# Altium footprint library MS-Electronic.PcbLib: 213 footprints (part 14 of 14)
Each footprint in its own frame and in the unit in brackets; x right, y up, seen from the top. Pads: shape width x height; smd on the part's side, far side on the other; paste and mask are expansions set on the pad; w line width, h text height; cw(c..) or ccw(c..) is an arc to the next point about the centre after c.
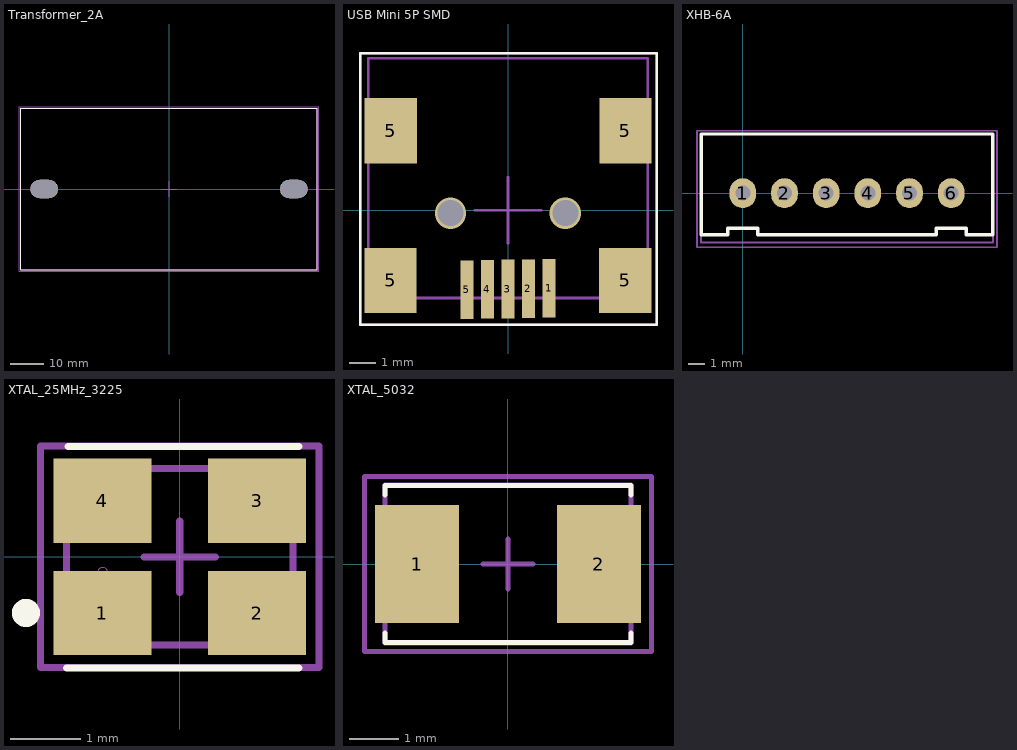
[diagram p13: the footprints below, top view; thin cyan lines are the x and y axes]

## Transformer_2A [mm]
pads (2):
  oval 8.2x5.5 hole 5.25 slot 8 at 0 deg: ""(-37,0) ""(37,0)
Top Overlay:
  lines w0.2: -44,-24 -44,0 -44,24 44,24 44,0 44,-24 -44,-24
Top Assembly:
  lines w0.2: -44,-24 44,-24 44,24 -44,24 -44,-24
  text ".Designator" at -4.998,-0.333 h1
Top Component Center (Mech15):
  lines w0.1: -2.286,0 0,0 ; 0,-2.286 0,0 ; 0,2.286 0,0 ; 2.286,0 0,0 ; -44.45,-24.384 44.45,-24.384 44.45,24.388 -44.45,24.388 -44.45,-24.384
3D body: height 52, standoff 0, extent -44,-24 44,24

## USB Mini 5P SMD [mm]
pads (9):
  rect 0.5x2.25 smd: 1(1.573,-2.997) 2(0.785,-3.01) 3(-0.002,-3.023) 4(-0.79,-3.035) 5(-1.577,-3.048)
  rect 2x2.5 smd: 5(-4.502,-2.692) 5(-4.498,3.048) 5(4.498,-2.692) 5(4.502,3.048)
via 2.198,-0.112 diameter 1.2 hole 1
via -2.202,-0.112 diameter 1.2 hole 1
Top Overlay:
  lines w0.1: -5.666,-4.394 -5.666,6.02 5.702,6.02 5.702,-4.394 -5.666,-4.394
Top Assembly:
  lines w0.1: -5.356,-3.366 -5.356,5.833 5.352,5.833 5.352,-3.366 -5.356,-3.366
  text ".Designator" at -3.999,-0.267 h0.8
Top Component Center (Mech15):
  lines w0.1: -1.27,0 0,0 ; 0,-1.27 0,0 ; 0,1.27 0,0 ; 1.27,0 0,0 ; -5.666,-4.394 -5.666,6.02 5.702,6.02 5.702,-4.394 -5.666,-4.394
3D body "User Library-USB_mini_B.step": height 3.95, standoff -1, extent -5.352,-3.365 5.348,5.835

## XHB-6A [mm]
pads (6):
  oval 1.6x1.8 hole 0.9: 1(0,0) 2(2.5,0) 3(5,0) 4(7.5,0) 5(10,0) 6(12.5,0)
Top Overlay:
  lines w0.2: -2.5,-2.5 -0.9,-2.5 -0.9,-2.1 0.9,-2.1 0.9,-2.5 11.6,-2.5 11.6,-2.1 13.4,-2.1 13.4,-2.5 15,-2.5 15,3.55 -2.5,3.55 -2.5,-2.5
Top Assembly:
  lines w0.127: -2.5,-2.95 -2.5,3.55 15,3.55 15,-2.95 -2.5,-2.95
  text ".Designator" at -2.499,-0.167 h0.5
Top Component Center (Mech15):
  lines w0.1: -0.762,0 0,0 ; 0,-0.762 0,0 ; 0,0.762 0,0 ; 0.762,0 0,0 ; -2.75,-3.25 15.25,-3.25 15.25,3.75 -2.75,3.75 -2.75,-3.25
3D body "x8821wv-06l-n0sn.stp": height 2.8, standoff -7.8, extent -2.5,-2.954 15,3.55

## XTAL_25MHz_3225 [mm]
height 0.9
pads (4):
  rect 1.4x1.2 smd paste+0: 1(-1.1,-0.8) 2(1.1,-0.8) 3(1.1,0.8) 4(-1.1,0.8)
Top Overlay:
  circle w0.2: c-2.188,-0.799 r0.1
  lines w0.1: -1.61,-1.581 1.697,-1.581 ; -1.593,1.574 1.697,1.574
Top Assembly:
  lines w0.1: -1.6,-0.635 cw(c-1.638,-1.206) -1.067,-1.245 ; -1.615,-1.256 1.609,-1.256 1.609,1.254 -1.615,1.254 -1.615,-1.256
  text ".Designator" at -2.999,-0.2 h0.6
Top 3D Body:
  circle w0: c-1.1,-0.228 r0.076
Top Component Center (Mech15):
  lines w0.1: -0.508,0 0,0 ; 0,-0.508 0,0 ; 0,0.508 0,0 ; 0.508,0 0,0 ; -1.979,-1.578 1.982,-1.578 1.982,1.575 -1.979,1.575 -1.979,-1.578
3D body "TSX-3225_24.0000MF20G-AC0.step": height 0.6, standoff 0, extent -1.6,-1.25 1.6,1.25

## XTAL_5032 [mm]
pads (2):
  rect 1.7x2.4 smd: 1(-1.85,0) 2(1.85,0)
Top Overlay:
  lines w0.1: -2.5,-1.4 -2.5,-1.6 2.5,-1.6 2.5,-1.4 ; -2.5,1.4 -2.5,1.6 2.5,1.6 2.5,1.4
Top Assembly:
  lines w0.1: -2.501,-1.61 -2.501,1.603 2.502,1.603 2.502,-1.61 -2.501,-1.61
  text ".Designator" at -2.499,-0.167 h0.5
Top Component Center (Mech15):
  lines w0.1: -0.508,0 0,0 ; 0,-0.508 0,0 ; 0,0.508 0,0 ; 0.508,0 0,0 ; -2.921,-1.778 -2.921,1.778 2.921,1.778 2.921,-1.778 -2.921,-1.778
3D body "crystal 8MHz.stp": height 1.2, standoff 0, extent -2.5,-1.6 2.5,1.6